# Altium footprint library PcbLib_jp.PcbLib: 178 footprints (part 12 of 12)
Each footprint in its own frame and in the unit in brackets; x right, y up, seen from the top. Pads: shape width x height; smd on the part's side, far side on the other; paste and mask are expansions set on the pad; w line width, h text height; cw(c..) or ccw(c..) is an arc to the next point about the centre after c.
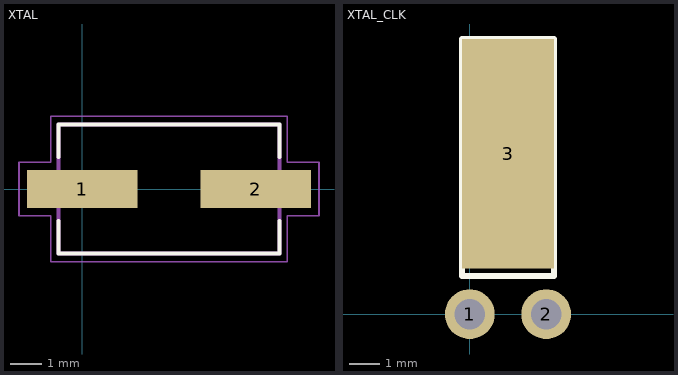
[diagram p11: the footprints below, top view; thin cyan lines are the x and y axes]

## XTAL [mm]
pads (2):
  rect 3.5x1.2 smd: 1(0,0) 2(5.5,0)
Top Overlay:
  lines w0.127: -0.75,-1.01 -0.75,-2.05 6.25,-2.05 6.25,-1.01 ; -0.75,1.01 -0.75,2.05 6.25,2.05 6.25,1.01
Mechanical 13:
  lines w0.127: -0.75,-2.05 6.25,-2.05 ; -0.75,-2.05 -0.75,2.05 ; -0.75,-2.05 6.25,-2.05 ; -0.75,-2.05 -0.75,2.05 ; -0.75,2.05 6.25,2.05 ; -0.75,2.05 6.25,2.05 ; 6.25,-2.05 6.25,2.05 ; 6.25,-2.05 6.25,2.05
Mechanical 16:
  lines w0.05: -2,-0.85 -1,-0.85 -1,-2.3 6.5,-2.3 6.5,-0.85 7.5,-0.85 7.5,0.85 6.5,0.85 6.5,2.3 -1,2.3 -1,0.85 -2,0.85 -2,-0.85
3D body "User Library-CSM-3X.STEP": height 2.3, standoff 0, extent -1.082,-2.043 6.518,2.057

## XTAL_CLK [mil]
pads (3):
  round 65 / inner round 60 / far side round 65 hole 40 mask+7: 1(0,0) 2(100,0)
  rect 120x300 smd mask+10: 3(50,210)
Top Overlay:
  lines w8: -10,50 110,50 110,360 -10,360 -10,50